# Altium integrated library 刘兴达Lib.IntLib: 614 symbols (part 2 of 4) (continued)
## MPC5602_64P (continued)

## MPU6050
designator U？  (value not drawn)
footprint MPU6050
pins: 1 CLKIN, 2 NC, 3 NC, 4 NC, 5 NC, 6 AUX_DA, 7 AUX_CL, 8 VLOGIC, 9 AD0, 10 REGOUT, 11 FSYNC, 12 INT, 13 VDD, 14 NC, 15 NC, 16 NC, 17 NC, 18 GND, 19 RESV, 20 CPOUT, 21 RESV, 22 RESV, 23 SCL, 24 SDA
text: MPU-6050

## MPU9250
designator U?  (value not drawn)
九轴陀螺仪
footprint MPU9250
pins: 1 RESV, 2 NC, 3 NC, 4 NC, 5 NC, 6 NC, 7 AUX_CL, 8 VDDIO, 9 AD0/SDO, 10 REGOUT, 11 FSYNC, 12 INT, 13 VDD, 14 NC, 15 NC, 16 NC, 17 NC, 18 GND, 19 RESV, 20 RESV, 21 AUX_DA, 22 nCS, 23 SCL/SCLK, 24 SDA/SDI
text: MPU-9250

## MPU_6050
designator U*
陀螺仪
footprint QFN_24
pins: 1 CLin, 2 NC, 3 NC, 4 NC, 5 NC, 6 DA, 7 CL, 8 VLOGIC, 9 AD0, 10 REGOUT, 11 FSYNC, 12 INT, 13 VDD, 14 NC, 15 NC, 16 NC, 17 NC, 18 GND, 19 RESV, 20 CPOUT, 21 RESV, 22 RESV, 23 SCL, 24 SDA

## MS2100
designator U?
footprint LQFP100_L (Thin QFP, 100-Leads, Body 14x14mm, Pitch 0.5mm, IPC High Density)
pins: 1 AVDD33, 2 AVSS, 3 SVCIN, 4 AVDD33, 5 AVSS, 6 SVYIN, 7 AVDD33, 8 AVIN, 9 AVSS, 10 DM13, 11 MD12, 12 MD11, 13 MD10, 14 MD9, 15 MD8, 16 MD7, 17 MD6, 18 MD5, 19 DVDD33, 20 DVSS, 21 MD4, 22 MD3, 23 MD2, 24 SDA, 25 SCL, 26 DVD33, 27 MWEB, 28 MCASB, 29 MRASB, 30 MCSB, 31 MBA0, 32 REV, 33 MA10, 34 MA0, 35 MA1, 36 MA2, 37 MA3, 38 AVSS, 39 VDD5V, 40 VDDO33, 41 VLDO12, 42 GPIO4, 43 DVDD33, 44 DVSS, 45 MA4, 46 MA5, 47 MA6, 48 MA7, 49 MA8, 50 MA9, 51 MCKE, 52 MCLK, 53 DVDD12, 54 AVDD12, 55 XTOUT, 56 XTIN, 57 AVSS, 58 AVSS, 59 AVDD33_USB, 60 REXT, 61 USBDP, 62 USBDM, 63 DVDD33, 64 GPIO0, 65 MD0, 66 MD1, 67 MD15, 68 MD14, 69 DVDD33, 70 DVSS, 71 I2S_SCLK, 72 I2S_MCLK, 73 I2S_SD0, 74 I2S_LLRCLK, 75 AVDD33_AU, 76 REV, 77 REV, 78 REV, 79 REV, 80 AVSS, 81 DVDD33, 82 NC, 83 NC, 84 DVSS, 85 NC, 86 NC, 87 NC, 88 NC, 89 NC, 90 NC, 91 NC, 92 DVDD33, 93 NC, 94 NC, 95 NC, 96 NC, 97 NC, 98 NC, 99 NC, 100 DVSS

## MT9700
designator U?
功率电子开关
footprint SOT23-5 (Max4173)
pins: 1 VOUT, 2 GND, 3 SET, 4 EN, 5 VIN

## NAND512W3A2S
designator U?
NANDFLASH
footprint TSOP-48
pins: 1 NC hidden, 2 NC hidden, 3 NC hidden, 4 NC hidden, 5 NC hidden, 6 NC hidden, 7 ~{RB}, 8 ~{R}, 9 ~{E}, 10 NC hidden, 11 NC hidden, 12 VDD, 13 VSS, 14 NC hidden, 15 NC hidden, 16 CL, 17 AL, 18 ~{W}, 19 ~{WP}, 20 NC hidden, 21 NC hidden, 22 NC hidden, 23 NC hidden, 24 NC hidden, 25 NC hidden, 26 NC hidden, 27 NC hidden, 28 NC hidden, 29 I/O0, 30 I/O1, 31 I/O2, 32 I/O3, 33 NC hidden, 34 NC hidden, 35 NC hidden, 36 VSS, 37 VDD, 38 NC hidden, 39 NC hidden, 40 NC hidden, 41 I/O4, 42 I/O5, 43 I/O6, 44 I/O7, 45 NC hidden, 46 NC hidden, 47 NC hidden, 48 NC hidden

## NC7WZU04P6X
designator U?
双反相器
footprint SC-70-6
pins: 1 A1, 2 GND, 3 A2, 4 Y2, 5 VCC, 6 Y1

## NE555
designator U?
Manufacturer: Texas Instruments; GENERIC_PART_NUMBER: NE555; INDUSTRY_STD_PKG_TYPE: SOIC; FAMILY_NAME: TIMERS(CT); PIN_COUNT: 8; PACKAGE_DESIGNATOR: D; Datasheet_URL: http://www.ti.com/lit/gpn/NE555; Copyright: Copyright (C) 2018 Accelerated Designs. All rights reserved; RefDes: RefDes; Type: DEV
footprint SOIC-8 (3mm)
pins: 1 GND (power), 2 TRIG (in), 3 OUT (out), 4 RESET (in), 5 CONT, 6 THRES (in), 7 DISCH, 8 VCC (power)

## NE555_1
designator U?  (value not drawn)
footprint SOIC-8
pins: 1 GND (power), 2 TRI (power), 3 OUT (out), 4 RESET (power), 5 CON (power), 6 THR (power), 7 DIS (power), 8 VCC (power)

## NPN1
designator Q?, comment NPN
贴片三极管; Published: 8-Jun-2000; LatestRevisionDate: 15-Jan-2003; LatestRevisionNote: PCB Footprint 'BCY-W3/D4.7' replaced; DatasheetDocument: 1997; PackageDocument: Sep-1998; PackageReference: TO-92A; Publisher: Altium Limited; Code_JEDEC: TO-92A; ComponentLink1Description: Manufacturer Link; ComponentLink1URL: http://www.fairchildsemi.com/; ComponentLink2Description: Datasheet; ComponentLink2URL: http://www.fairchildsemi.com/ds/2N%2F2N3904.pdf
footprint SOT23-3
pins: 1 B, 2 E, 3 C

## NPN2
designator Q?, comment NPN
三极管; Published: 8-Jun-2000; LatestRevisionDate: 15-Jan-2003; LatestRevisionNote: PCB Footprint 'BCY-W3/D4.7' replaced; DatasheetDocument: 1997; PackageDocument: Sep-1998; PackageReference: TO-92A; Publisher: Altium Limited; Code_JEDEC: TO-92A; ComponentLink1Description: Manufacturer Link; ComponentLink1URL: http://www.fairchildsemi.com/; ComponentLink2Description: Datasheet; ComponentLink2URL: http://www.fairchildsemi.com/ds/2N%2F2N3904.pdf
footprint TO-92A (TO, Flat Index; 3 In-Line, Axial Leads; Body Dia. 4.5mm; Leads 0.51 x 0.48 mm (max))
pins: 1 E, 2 B, 3 C

## Nucleo-64 Arduino接口
designator U?
footprint Nucleo-64 Arduino接口
pins: 1 NC, 2 3.3V, 3 NRST, 4 3.3V, 5 5V, 6 GND, 7 GND, 8 Vin, 9 PA0, 10 PA1, 11 PA4, 12 PB0, 13 PC1, 14 PC0, 15 PA3, 16 PA2, 17 PA10, 18 PB3, 19 PB5, 20 PB4, 21 PB10, 22 PA8, 23 PA9, 24 PC7, 25 PB6, 26 PA7, 27 PA6, 28 PA5, 29 GND, 30 AVDD, 31 PB9, 32 PB8

## OLED
designator U?  (value not drawn)
footprint OLED
pins: 1 GND, 2 C2P, 3 C2N, 4 C1P, 5 C1N, 6 VBAT, 7 NC, 8 VSS, 9 VDD, 10 BS0, 11 BS1, 12 BS2, 13 CS, 14 RES, 15 D/C, 16 R/W, 17 E/RD, 18 D0, 19 D1, 20 D2, 21 D3, 22 D4, 23 D5, 24 D6, 25 D7, 26 IREF, 27 VCOMH, 28 VCC, 29 VLSS, 30 GND

## OLED_1
designator U?  (value not drawn)
footprint OLED
pins: 1 GND, 2 C2P, 3 C2N, 4 C1P, 5 C1N, 6 VBAT, 7 NC, 8 VSS, 9 VDD, 10 BS0, 11 BS1, 12 BS2, 13 CS, 14 RES, 15 D/C, 16 R/W, 17 E/RD, 18 D0, 19 D1, 20 D2, 21 D3, 22 D4, 23 D5, 24 D6, 25 D7, 26 IREF, 27 VCOMH, 28 VCC, 29 VLSS, 30 GND

## OLED_SPI_7P
designator U?
footprint OLED_SPI_7P (SPI驱动0.96寸OLED)
pins: 1 GND, 2 VCC, 3 D0, 4 D1, 5 RES, 6 D/C, 7 CS
text: OLED_096

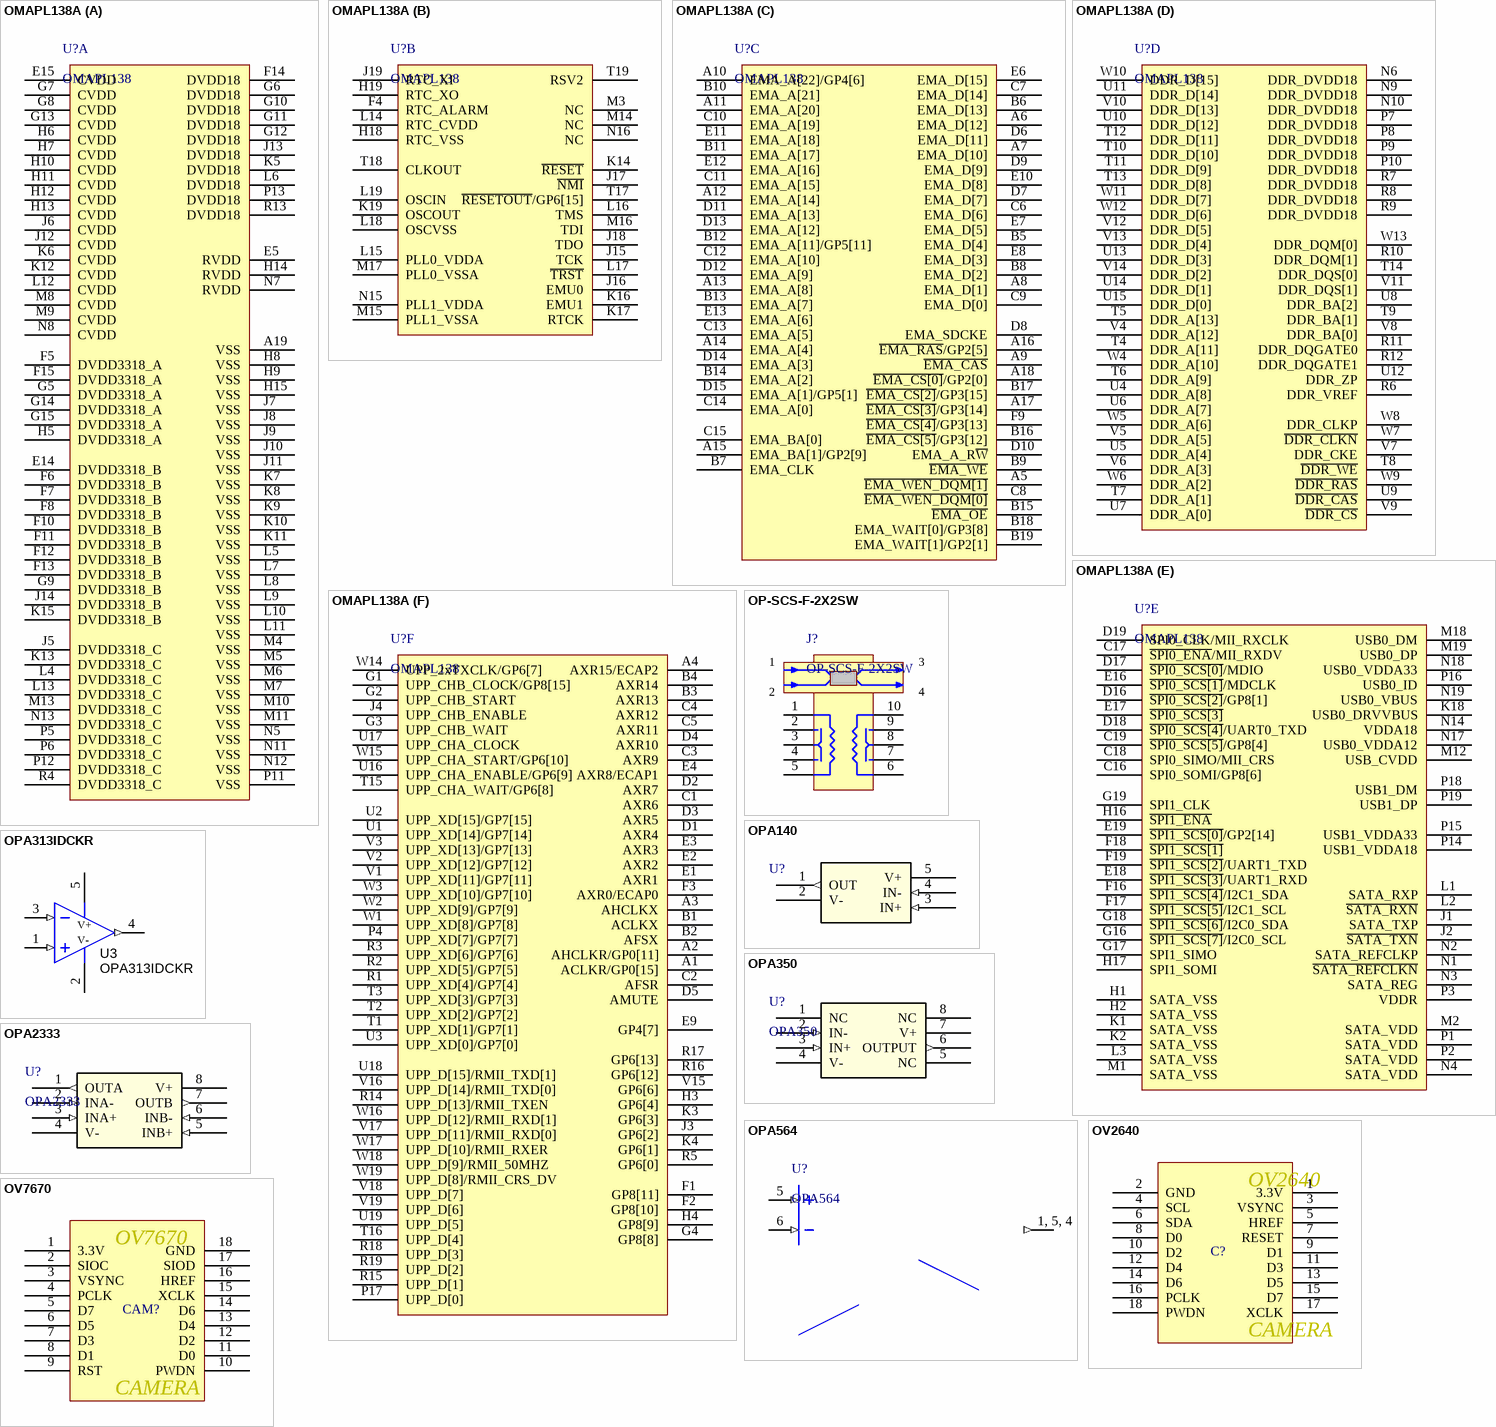
[diagram p15: symbols OMAPL138A to OV7670]

## OMAPL138A
designator U?, comment OMAPL138
DSP&ARM
footprint UFBGA361
part A pins: A19 VSS, E5 RVDD, E14 DVDD3318_B, E15 CVDD, F5 DVDD3318_A, F6 DVDD3318_B, F7 DVDD3318_B, F8 DVDD3318_B, F10 DVDD3318_B, F11 DVDD3318_B, F12 DVDD3318_B, F13 DVDD3318_B, F14 DVDD18, F15 DVDD3318_A, G5 DVDD3318_A, G6 DVDD18, G7 CVDD, G8 CVDD, G9 DVDD3318_B, G10 DVDD18, G11 DVDD18, G12 DVDD18, G13 CVDD, G14 DVDD3318_A, G15 DVDD3318_A, H5 DVDD3318_A, H6 CVDD, H7 CVDD, H8 VSS, H9 VSS, H10 CVDD, H11 CVDD, H12 CVDD, H13 CVDD, H14 RVDD, H15 VSS, J5 DVDD3318_C, J6 CVDD, J7 VSS, J8 VSS, J9 VSS, J10 VSS, J11 VSS, J12 CVDD, J13 DVDD18, J14 DVDD3318_B, K5 DVDD18, K6 CVDD, K7 VSS, K8 VSS, K9 VSS, K10 VSS, K11 VSS, K12 CVDD, K13 DVDD3318_C, K15 DVDD3318_B, L4 DVDD3318_C, L5 VSS, L6 DVDD18, L7 VSS, L8 VSS, L9 VSS, L10 VSS, L11 VSS, L12 CVDD, L13 DVDD3318_C, M4 VSS, M5 VSS, M6 VSS, M7 VSS, M8 CVDD, M9 CVDD, M10 VSS, M11 VSS, M13 DVDD3318_C, N5 VSS, N7 RVDD, N8 CVDD, N11 VSS, N12 VSS, N13 DVDD3318_C, P5 DVDD3318_C, P6 DVDD3318_C, P11 VSS, P12 DVDD3318_C, P13 DVDD18, R4 DVDD3318_C, R13 DVDD18
part B pins: F4 RTC_ALARM, H18 RTC_VSS, H19 RTC_XO, J15 TCK, J16 EMU0, J17 ~{NMI}, J18 TDO, J19 RTC_XI, K14 ~{RESET}, K16 EMU1, K17 RTCK, K19 OSCOUT, L14 RTC_CVDD, L15 PLL0_VDDA, L16 TMS, L17 ~{TRST}, L18 OSCVSS, L19 OSCIN, M3 NC, M14 NC, M15 PLL1_VSSA, M16 TDI, M17 PLL0_VSSA, N15 PLL1_VDDA, N16 NC, T17 ~{RESETOUT}/GP6[15], T18 CLKOUT, T19 RSV2
part C pins: A5 ~{EMA_WEN_DQM[1]}, A6 EMA_D[12], A7 EMA_D[10], A8 EMA_D[1], A9 ~{EMA_CAS}, A10 EMA_A[22]/GP4[6], A11 EMA_A[20], A12 EMA_A[14], A13 EMA_A[8], A14 EMA_A[4], A15 EMA_BA[1]/GP2[9], A16 ~{EMA_RAS}/GP2[5], A17 ~{EMA_CS[3]}/GP3[14], A18 ~{EMA_CS[0]}/GP2[0], B5 EMA_D[4], B6 EMA_D[13], B7 EMA_CLK, B8 EMA_D[2], B9 ~{EMA_WE}, B10 EMA_A[21], B11 EMA_A[17], B12 EMA_A[11]/GP5[11], B13 EMA_A[7], B14 EMA_A[2], B15 ~{EMA_OE}, B16 ~{EMA_CS[5]}/GP3[12], B17 ~{EMA_CS[2]}/GP3[15], B18 EMA_WAIT[0]/GP3[8], B19 EMA_WAIT[1]/GP2[1], C6 EMA_D[6], C7 EMA_D[14], C8 ~{EMA_WEN_DQM[0]}, C9 EMA_D[0], C10 EMA_A[19], C11 EMA_A[15], C12 EMA_A[10], C13 EMA_A[5], C14 EMA_A[0], C15 EMA_BA[0], D6 EMA_D[11], D7 EMA_D[7], D8 EMA_SDCKE, D9 EMA_D[9], D10 EMA_A_R~{W}, D11 EMA_A[13], D12 EMA_A[9], D13 EMA_A[12], D14 EMA_A[3], D15 EMA_A[1]/GP5[1], E6 EMA_D[15], E7 EMA_D[5], E8 EMA_D[3], E10 EMA_D[8], E11 EMA_A[18], E12 EMA_A[16], E13 EMA_A[6], F9 ~{EMA_CS[4]}/GP3[13]
part D pins: N6 DDR_DVDD18, N9 DDR_DVDD18, N10 DDR_DVDD18, P7 DDR_DVDD18, P8 DDR_DVDD18, P9 DDR_DVDD18, P10 DDR_DVDD18, R6 DDR_VREF, R7 DDR_DVDD18, R8 DDR_DVDD18, R9 DDR_DVDD18, R10 DDR_DQM[1], R11 DDR_DQGATE0, R12 DDR_DQGATE1, T4 DDR_A[11], T5 DDR_A[13], T6 DDR_A[9], T7 DDR_A[1], T8 ~{DDR_WE}, T9 DDR_BA[1], T10 DDR_D[10], T11 DDR_D[9], T12 DDR_D[11], T13 DDR_D[8], T14 DDR_DQS[0], U4 DDR_A[8], U5 DDR_A[4], U6 DDR_A[7], U7 DDR_A[0], U8 DDR_BA[2], U9 ~{DDR_CAS}, U10 DDR_D[12], U11 DDR_D[14], U12 DDR_ZP, U13 DDR_D[3], U14 DDR_D[1], U15 DDR_D[0], V4 DDR_A[12], V5 DDR_A[5], V6 DDR_A[3], V7 DDR_CKE, V8 DDR_BA[0], V9 ~{DDR_CS}, V10 DDR_D[13], V11 DDR_DQS[1], V12 DDR_D[5], V13 DDR_D[4], V14 DDR_D[2], W4 DDR_A[10], W5 DDR_A[6], W6 DDR_A[2], W7 ~{DDR_CLKN}, W8 DDR_CLKP, W9 ~{DDR_RAS}, W10 DDR_D[15], W11 DDR_D[7], W12 DDR_D[6], W13 DDR_DQM[0]
part E pins: C16 SPI0_SOMI/GP8[6], C17 ~{SPI0_ENA}/MII_RXDV, C18 SPI0_SIMO/MII_CRS, C19 ~{SPI0_SCS[5]}/GP8[4], D16 ~{SPI0_SCS[2]}/GP8[1], D17 ~{SPI0_SCS[0]}/MDIO, D18 ~{SPI0_SCS[4]}/UART0_TXD, D19 SPI0_CLK/MII_RXCLK, E16 ~{SPI0_SCS[1]}/MDCLK, E17 ~{SPI0_SCS[3]}, E18 ~{SPI1_SCS[3]}/UART1_RXD, E19 ~{SPI1_SCS[0]}/GP2[14], F16 ~{SPI1_SCS[4]}/I2C1_SDA, F17 ~{SPI1_SCS[5]}/I2C1_SCL, F18 ~{SPI1_SCS[1]}, F19 ~{SPI1_SCS[2]}/UART1_TXD, G16 ~{SPI1_SCS[7]}/I2C0_SCL, G17 SPI1_SIMO, G18 ~{SPI1_SCS[6]}/I2C0_SDA, G19 SPI1_CLK, H1 SATA_VSS, H2 SATA_VSS, H16 ~{SPI1_ENA}, H17 SPI1_SOMI, J1 SATA_TXP, J2 ~{SATA_TXN}, K1 SATA_VSS, K2 SATA_VSS, K18 USB0_DRVVBUS, L1 SATA_RXP, L2 ~{SATA_RXN}, L3 SATA_VSS, M1 SATA_VSS, M2 SATA_VDD, M12 USB_CVDD, M18 USB0_DM, M19 USB0_DP, N1 ~{SATA_REFCLKN}, N2 SATA_REFCLKP, N3 SATA_REG, N4 SATA_VDD, N14 VDDA18, N17 USB0_VDDA12, N18 USB0_VDDA33, N19 USB0_VBUS, P1 SATA_VDD, P2 SATA_VDD, P3 VDDR, P14 USB1_VDDA18, P15 USB1_VDDA33, P16 USB0_ID, P18 USB1_DM, P19 USB1_DP
part F pins: A1 ACLKR/GP0[15], A2 AHCLKR/GP0[11], A3 AHCLKX, A4 AXR15/ECAP2, B1 ACLKX, B2 AFSX, B3 AXR13, B4 AXR14, C1 AXR6, C2 AFSR, C3 AXR9, C4 AXR12, C5 AXR11, D1 AXR4, D2 AXR7, D3 AXR5, D4 AXR10, D5 AMUTE, E1 AXR1, E2 AXR2, E3 AXR3, E4 AXR8/ECAP1, E9 GP4[7], F1 GP8[11], F2 GP8[10], F3 AXR0/ECAP0, G1 UPP_CHB_CLOCK/GP8[15], G2 UPP_CHB_START, G3 UPP_CHB_WAIT, G4 GP8[8], H3 GP6[4], H4 GP8[9], J3 GP6[2], J4 UPP_CHB_ENABLE, K3 GP6[3], K4 GP6[1], P4 UPP_XD[7]/GP7[7], P17 UPP_D[0], R1 UPP_XD[4]/GP7[4], R2 UPP_XD[5]/GP7[5], R3 UPP_XD[6]/GP7[6], R5 GP6[0], R14 UPP_D[13]/RMII_TXEN, R15 UPP_D[1], R16 GP6[12], R17 GP6[13], R18 UPP_D[3], R19 UPP_D[2], T1 UPP_XD[1]/GP7[1], T2 UPP_XD[2]/GP7[2], T3 UPP_XD[3]/GP7[3], T15 UPP_CHA_WAIT/GP6[8], T16 UPP_D[4], U1 UPP_XD[14]/GP7[14], U2 UPP_XD[15]/GP7[15], U3 UPP_XD[0]/GP7[0], U16 UPP_CHA_ENABLE/GP6[9], U17 UPP_CHA_CLOCK, U18 UPP_D[15]/RMII_TXD[1], U19 UPP_D[5], V1 UPP_XD[11]/GP7[11], V2 UPP_XD[12]/GP7[12], V3 UPP_XD[13]/GP7[13], V15 GP6[6], V16 UPP_D[14]/RMII_TXD[0], V17 UPP_D[11]/RMII_RXD[0], V18 UPP_D[7], V19 UPP_D[6], W1 UPP_XD[8]/GP7[8], W2 UPP_XD[9]/GP7[9], W3 UPP_XD[10]/GP7[10], W14 UPP_2xTXCLK/GP6[7], W15 UPP_CHA_START/GP6[10], W16 UPP_D[12]/RMII_RXD[1], W17 UPP_D[10]/RMII_RXER, W18 UPP_D[9]/RMII_50MHZ, W19 UPP_D[8]/RMII_CRS_DV

## OP-SCS-F-2X2SW
designator J?
光开关
footprint SCS-F-2X2
pins: 1 SWA, 2 SWAK1, 3 SWAK2, 4 SWAK3, 5 SWA, 6 SWB, 7 SWBK3, 8 SWBK2, 9 SWBK1, 10 SWB

## OPA140
designator U?
11MHz 单电源、低噪声、精密轨至轨输出 JFET 放大器; Manufacturer: Texas Instruments; Manufacturer_Part_Number: OPA140AIDBVR; Built_By: EMA_UL_Team; Vendor: Texas Instruments; Copyright: Copyright (C) 2018 Accelerated Designs. All rights reserved; RefDes: RefDes; Type: DEV; Value: Value
footprint SOT-23-5
pins: 1 OUT (out), 2 V- (power), 3 IN+ (in), 4 IN- (in), 5 V+ (power)

## OPA313IDCKR
designator U3
运放; Alternate PartNumber: OPA313IDCKT; Manufacturer: Texas Instruments; CompType: IC; Sim Note: Shutdown not modeled; U/M: EA; SymbolVersion: 2008-11-25; PartNumber: OPA313IDCKR; PackageReference: DCK0005A; MountType: SMT; ComponentLink1Description: Datasheet Link; ComponentLink1URL: http://www.ti.com/lit/ds/symlink/opa313.pdf; RoHS: Y; Publisher: Texas Instruments; LatestRevisionDate: 2016-03-11; Alternate Manufacturer: Texas Instruments
footprint SC-70-5
pins: 1 IN+ (in), 2 V- (power), 3 IN- (in), 4 OUT (out), 5 V+ (power)
1 alternate drawing of the same symbol

## OPA350
designator U?
单电源轨至轨运算放大器; Manufacturer_Part_Number: OPA350UA; Vendor: Texas Instruments; Built_By: EMA_UL_Team; Copyright: Copyright (C) 2018 Accelerated Designs. All rights reserved; RefDes: RefDes; Type: DEV; Value: Value
footprint SOIC-8 (3mm)
footprint VSSOP-8
pins: 1 NC, 2 IN- (in), 3 IN+ (in), 4 V- (power), 5 NC, 6 OUTPUT (out), 7 V+ (power), 8 NC

## OPA564
designator U?
功率运算放大器
footprint TSSOP-20P (TSOP, 20-Leads, Body 6.5x4.4mm, Pitch 0.65mm, IPC Low Density)
pins: 1, 5, 4  OUT (out), 5 IN+ (in), 6 IN- (in)

## OPA2333
designator U?
Manufacturer: Texas Instruments; GENERIC_PART_NUMBER: OPA2333-HT; Manufacturer_Part_Number: OPA2333SJD; INDUSTRY_STD_PKG_TYPE: CDIP SB; FAMILY_NAME: LOW OFFSET VOLTAGE; PIN_COUNT: 8; PACKAGE_DESIGNATOR: JD; Datasheet_URL: http://www.ti.com/lit/gpn/OPA2333-HT; Vendor: Texas Instruments; Copyright: Copyright (C) 2018 Accelerated Designs. All rights reserved; RefDes: RefDes; Type: DEV
footprint MSOP-8
footprint SOIC-8 (3mm)
pins: 1 OUTA (out), 2 INA- (in), 3 INA+ (in), 4 V- (power), 5 INB+ (in), 6 INB- (in), 7 OUTB (out), 8 V+ (power)

## OV2640
designator C?  (value not drawn)
摄像头
footprint OV2640
pins: 1 3.3V, 2 GND, 3 VSYNC, 4 SCL, 5 HREF, 6 SDA, 7 RESET, 8 D0, 9 D1, 10 D2, 11 D3, 12 D4, 13 D5, 14 D6, 15 D7, 16 PCLK, 17 XCLK, 18 PWDN
text: CAMERA

## OV7670
designator CAM?  (value not drawn)
摄像头
footprint OV7670
pins: 1 3.3V, 2 SIOC, 3 VSYNC, 4 PCLK, 5 D7, 6 D5, 7 D3, 8 D1, 9 RST, 10 PWDN, 11 D0, 12 D2, 13 D4, 14 D6, 15 XCLK, 16 HREF, 17 SIOD, 18 GND
text: CAMERA

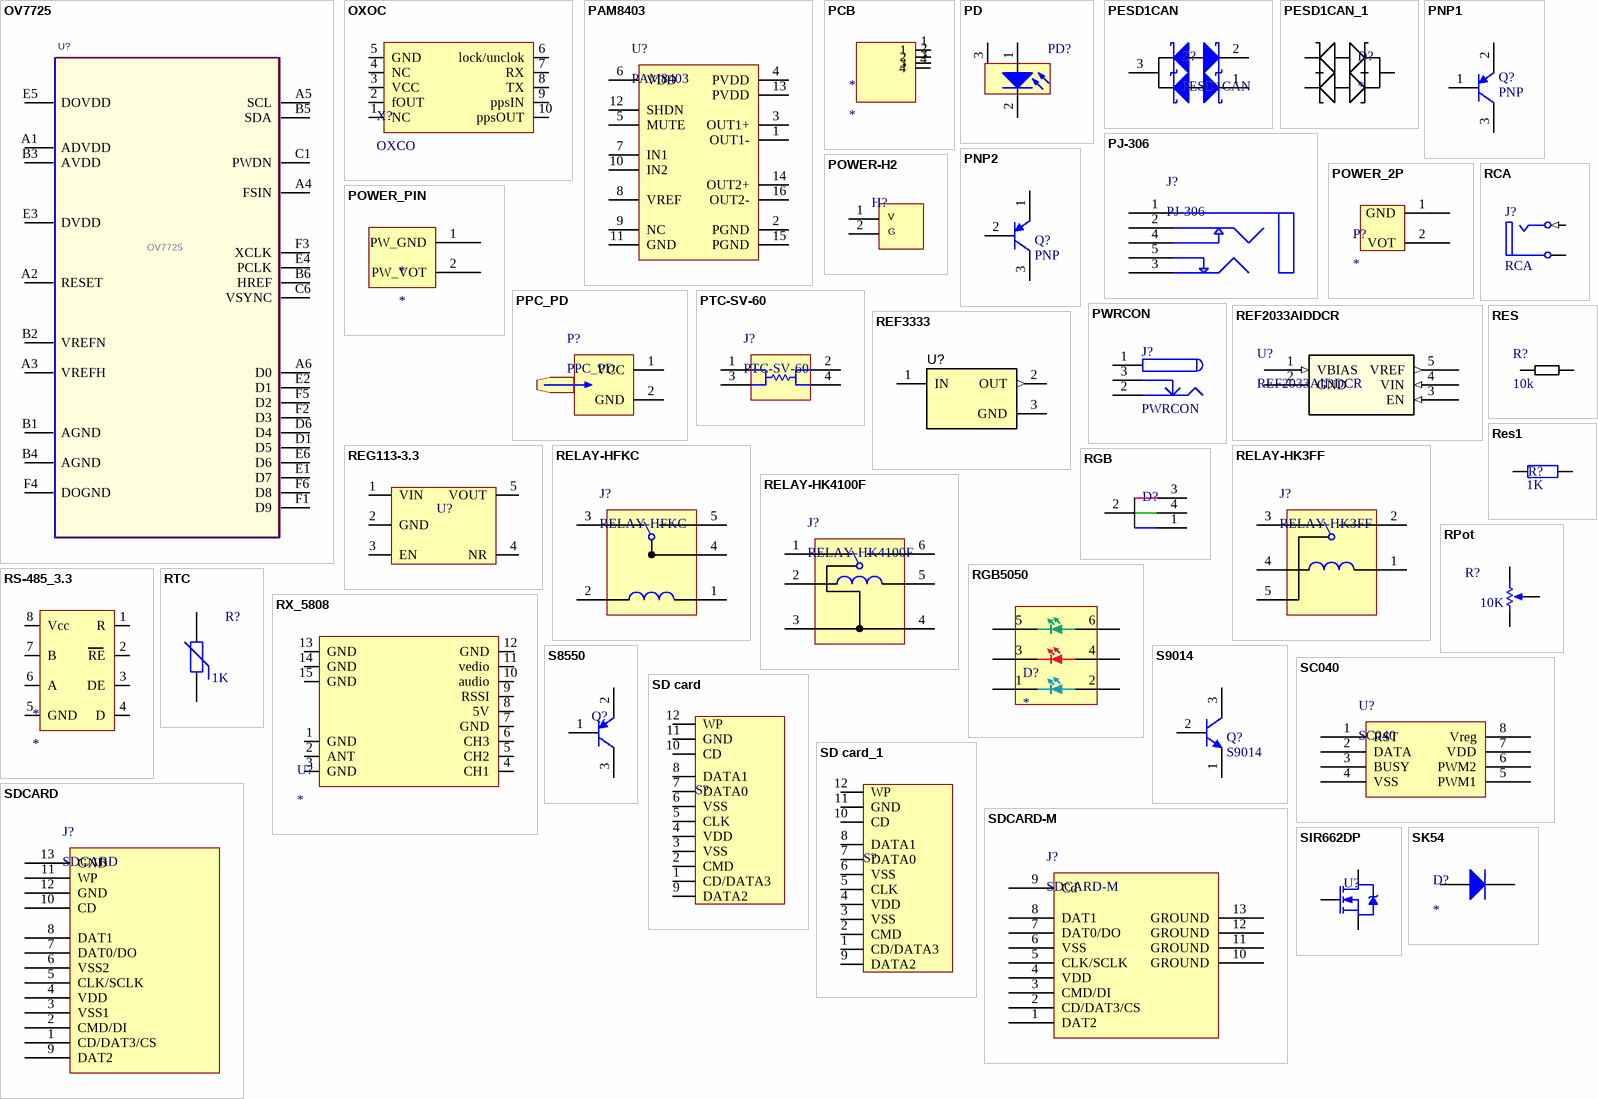
[diagram p16: symbols OV7725 to SK54]

## OV7725
designator U?  value OV7725
CMOS图像传感器; Manufacture 1: OV; Assembly: SMD; PCB DECAL: OV7725_CSP2_FIRE; Manufacture 1 P/N: OV7725
footprint CSP2-28
pins: A1 ADVDD, A2 RESET, A3 VREFH, A4 FSIN, A5 SCL, A6 D0, B1 AGND, B2 VREFN, B3 AVDD, B4 AGND, B5 SDA, B6 HREF, C1 PWDN, C6 VSYNC, D1 D5, D6 D4, E1 D7, E2 D1, E3 DVDD, E4 PCLK, E5 DOVDD, E6 D6, F1 D9, F2 D3, F3 XCLK, F4 DOGND, F5 D2, F6 D8

## OXOC
designator X?, comment OXCO
时钟驯服板
footprint OCXO (时钟驯服板)
pins: 1 NC, 2 fOUT, 3 VCC, 4 NC, 5 GND, 6 lock/unclok, 7 RX, 8 TX, 9 ppsIN, 10 ppsOUT

## PAM8403
designator U?
音频运放
footprint SOIC-16
pins: 1 OUT1-, 2 PGND, 3 OUT1+, 4 PVDD, 5 MUTE, 6 VDD, 7 IN1, 8 VREF, 9 NC, 10 IN2, 11 GND, 12 SHDN, 13 PVDD, 14 OUT2+, 15 PGND, 16 OUT2-

## PCB
designator *
pins: 1, 2, 3, 4

## PD
designator PD?  (value not drawn)
光电二极管; Published: 24-Mar-1999; LatestRevisionDate: 17-Jul-2002; LatestRevisionNote: Re-released for DXP Platform.; Publisher: Altium Limited; PackageReference: PD
footprint PD
footprint PD-SMD (光电二极管)
footprint PD-H (光电二极管)
pins: 1 A, 2 K, 3 0

## PESD1CAN
designator Z?
过压保护
footprint SOT23-3
pins: 1, 2, 3

## PESD1CAN_1
designator D?
CAN线ESD保护
footprint SOT-23-3
pins: 1, 2, 3

## PJ-306
designator J?
立体声耳机插座
footprint PJ-315-B (立体声耳机插座)
footprint PJ-306 (立体声耳机插座)
footprint 3F07 (立体声耳机插座)
pins: 1 COM, 2 L, 3 R, 4 L1, 5 R1

## PNP1
designator Q?, comment PNP
贴片三极管; Published: 8-Jun-2000; LatestRevisionDate: 15-Jan-2003; LatestRevisionNote: PCB Footprint 'BCY-W3/D4.7' replaced; DatasheetDocument: 1997; PackageDocument: Sep-1998; PackageReference: TO-92A; Publisher: Altium Limited; Code_JEDEC: TO-92A; ComponentLink1Description: Manufacturer Link; ComponentLink1URL: http://www.fairchildsemi.com/; ComponentLink2Description: Datasheet; ComponentLink2URL: http://www.fairchildsemi.com/ds/2N%2F2N3906.pdf
footprint SOT23-3
pins: 1 B, 2 E, 3 C

## PNP2
designator Q?, comment PNP
三极管; Published: 8-Jun-2000; LatestRevisionDate: 15-Jan-2003; LatestRevisionNote: PCB Footprint 'BCY-W3/D4.7' replaced; DatasheetDocument: 1997; PackageDocument: Sep-1998; PackageReference: TO-92A; Publisher: Altium Limited; Code_JEDEC: TO-92A; ComponentLink1Description: Manufacturer Link; ComponentLink1URL: http://www.fairchildsemi.com/; ComponentLink2Description: Datasheet; ComponentLink2URL: http://www.fairchildsemi.com/ds/2N%2F2N3906.pdf
footprint TO-92A (TO, Flat Index; 3 In-Line, Axial Leads; Body Dia. 4.5mm; Leads 0.51 x 0.48 mm (max))
pins: 1 E, 2 B, 3 C

## POWER-H2
designator H?  (value not drawn)
功率插座
footprint XT30UPB-F
footprint XT30UPB-M
footprint XT60PB-M
footprint XT60PW-F
footprint 8.4mm间距接线柱
footprint 9.5mm 接线座
footprint XT60PW-M
footprint XT30PW-F
pins: 1, 2
text: V; G

## POWER_2P
designator P?
间距200mil接口
footprint Power_2p (拧螺丝的那种两个口接口)
pins: 1 GND, 2 VOT

## POWER_PIN
designator *
电源接口
footprint Power_Pin (某种电源接口)
pins: 1 PW_GND, 2 PW_VOT

## PPC_PD
designator P?
footprint PPC_PD
pins: 1 VCC, 2 GND

## PTC-SV-60
designator J?
footprint PTC-SV-D20 (PTC加热片)
pins: 1, 2, 3, 4

## PWRCON
designator J?
直流电源端子; Published: 17-Dec-2003; DatasheetDocument: 09-May-2002; Publisher: Altium Limited; ComponentLink1Description: Manufacturer Link; ComponentLink1URL: http://domino.kycon.com/internet/Products.html
footprint DC-005 (DC母座5.5mm)
footprint DC-002 (DC母座3.5mm)
pins: 1 (power), 2 (power), 3 (power)

## RCA
designator J?
RCA Phono Jack; PCB_Layout: Complies with manufacturer's recommendation.; DrillAndSlotSize: Corresponds to nominal value.; Published: 15-Jul-2004; LatestRevisionDate: 15-Jul-2004; LatestRevisionNote: Component Replaced.; DatasheetDocument: 7-Jul-2000; PackageDocument: 7-Jul-2000; PackageReference: 161; Publisher: Altium Limited; ComponentLink1Description: Manufacturer Link; ComponentLink1URL: http://www.mouser.com/kobiconn/
footprint RCA/4.5-H2 (Two Conductor Jack (RCA))
footprint RCJ-04X (Two Conductor Jack (RCA))
pins: 1A Ground (power) "Outer Shield (Sleeve)", 2B Signal (in) "Center Pin (Plug Tip)"

## REF2033AIDDCR
designator U?
3.3V 1.65V基准; Vendor: Texas Instruments; Built_By: EMA_UL_Team; Manufacturer_Part_Number: REF2033AIDDCR; Copyright: Copyright (C) 2018 Accelerated Designs. All rights reserved; RefDes: RefDes; Type: DEV; Value: Value
footprint SOT-23-5
pins: 1 VBIAS (in), 2 GND (power), 3 EN (in), 4 VIN (in), 5 VREF (out)

## REF3333
designator U?
电压基准芯片; Manufacturer: Texas Instruments; PartNumber: REF3325AIDCKTG4; Alternate PartNumber: Equivalent; Eco-Plan: Green (RoHS & no Sb/Br); Initial Accuracy @ 25/deg C(%): 0.15; Iout/Iz(Max)(mA): 5; Rating: Catalog; SubFamily: Series Voltage Reference; Temp Coeff(Max)(ppm/ degree C): 30; Temp Coeff(Typ)(ppm/ degree C): 8; VI(Max)(V): 5.5; VI(Min)(V): 2.66; VO(V): 2.5; DatasheetVersion: SBOS392A; PackageReference: DCK0003A; PackageDescription: 3-Pin Plastic Small Outline, Body 2 x 1.25 mm, Pitch 0.65 mm; Supplier 1: Digi-Key; Supplier Part Number 1: REF3325AIDCKTG4-ND; Supplier 2: Newark; Supplier Part Number 2: 58M1154; Supplier 3: Mouser; Supplier Part Number 3: 595-REF3325AIDCKTG4; Iq(Max)(uA): 5; MountType: SMT; ComponentLink1Description: Manufacturer URL; ComponentLink1URL: http://www.ti.com/; ComponentLink2Description: Datasheet; ComponentLink2URL: http://www.ti.com/general/docs/lit/getliterature.tsp?genericPartNumber=REF3325&fileType=pdf; ComponentLink3Description: Package Specification; ComponentLink3URL: http://www.ti.com/litv/pdf/mpds295a; Alternate Manufacturer: Texas Instruments
footprint SOT23-3
pins: 1 IN (power), 2 OUT (out), 3 GND (power)

## REG113-3.3
designator U?  (value not drawn)
3.3V稳压电源
footprint REG113-3.3
pins: 1 VIN, 2 GND, 3 EN, 4 NR, 5 VOUT

## RELAY-HFKC
designator J?
单刀双掷继电器
footprint HFKC (继电器)
pins: 1, 2, 3, 4, 5

## RELAY-HK3FF
designator J?
单刀双掷继电器
footprint RELAY-HK3FF (继电器)
pins: 1, 2, 3, 4, 5

## RELAY-HK4100F
designator J?
单刀双掷继电器
footprint RELAY-HK4100F (继电器)
pins: 1, 2, 3, 4, 5, 6

## RES
designator R?, comment 10k
电阻; Manufacturer_Part_Number: ERJ-6GEYJ335V; Vendor: Panasonic; Built_By: EMA_UL_Team; Copyright: Copyright (C) 2018 Accelerated Designs. All rights reserved; RefDes: RefDes; Type: DEV; Value: Value
footprint R0805
footprint R0603
footprint R1206
footprint R2010
footprint R0402
pins: 1, 2

## Res1
designator R?  value 1K  (hidden comment: Res1)
贴片电阻; Published: 8-Jun-2000; LatestRevisionDate: 17-Jul-2002; LatestRevisionNote: Re-released for DXP Platform.; PackageReference: AXIAL-0.4; Publisher: Altium Limited
footprint 0805-1 (贴片带丝印)
footprint 0805-2 (贴片无丝印)
footprint 0603-1 (贴片带丝印)
footprint 1210 (贴片元件)
footprint AXIAL-0.8 (Semiconductor Resistor; 2 Leads)
footprint 2010 (贴片电阻)
footprint 0603-2 (贴片无丝印)
footprint 1206
footprint 2512 (保险丝)
footprint 1812 (保险丝)
footprint AXIAL-0.9 (插件电阻)
pins: 1, 2

## RGB
designator D?  (value not drawn)
三色LED
footprint RGB
pins: 1 OUT, 2 OUT, 3 OUT, 4 OUT

## RGB5050
designator D?
footprint RGB5050
pins: 1 G, 2 G, 3 G, 4 G, 5 G, 6 R

## RPot
designator R?  value 10K  (hidden comment: RPot)
精密可调电阻; Sim Note: Enter the Resistance value and the set point into parameter fields.; Set Position: 0.5; Published: 8-Jun-2000; LatestRevisionDate: 17-Jul-2002; LatestRevisionNote: Re-released for DXP Platform.; PackageReference: VR5; Publisher: Altium Limited
footprint VR-3296W (Potentiometer; 3 Leads)
footprint VR-3296X (Potentiometer; 3 Leads)
footprint VR-3006P
footprint VR_3362P (Potentiometer; 3 Leads)
pins: 1 TOP, 2 TAP, 3 BOT
1 alternate drawing of the same symbol

## RS-485_3.3
designator *
footprint SOIC-8
pins: 1 R, 2 RE, 3 DE, 4 D, 5 GND, 6 A, 7 B, 8 Vcc

## RTC
designator R?  value 1K  (hidden comment: RTC)
热敏电阻; Published: 24-Mar-1999; LatestRevisionDate: 29-May-2009; LatestRevisionNote: IPC-7351 Footprint Added.; PackageVersion: Mar-2003; PackageReference: 6-0805; Publisher: Altium Limited; PackageDescription: Chip Resistor 0805 Case Size
footprint 0603-1 (0603带丝印)
footprint 0805-1 (0805带丝印)
pins: 1, 2

## RX_5808
designator U?
footprint RX_5808 (图传接收)
pins: 1 GND, 2 ANT, 3 GND, 4 CH1, 5 CH2, 6 CH3, 7 GND, 8 5V, 9 RSSI, 10 audio, 11 vedio, 12 GND, 13 GND, 14 GND, 15 GND

## S8550
designator Q?  (value not drawn)
pins: 1 B, 2 E, 3 C

## S9014
designator Q?
NPN三极管; Published: 8-Jun-2000; LatestRevisionDate: 15-Jan-2003; LatestRevisionNote: PCB Footprint 'BCY-W3/D4.7' replaced; DatasheetDocument: 1997; PackageDocument: Sep-1998; PackageReference: TO-92A; Publisher: Altium Limited; Code_JEDEC: TO-92A; ComponentLink1Description: Manufacturer Link; ComponentLink1URL: http://www.fairchildsemi.com/; ComponentLink2Description: Datasheet; ComponentLink2URL: http://www.fairchildsemi.com/ds/2N%2F2N3904.pdf
footprint TO-92A (TO, Flat Index; 3 In-Line, Axial Leads; Body Dia. 4.5mm; Leads 0.51 x 0.48 mm (max))
pins: 1 E, 2 B, 3 C

## SC040
designator U?
语音
footprint SOIC-8
pins: 1 RST, 2 DATA, 3 BUSY, 4 VSS, 5 PWM1, 6 PWM2, 7 VDD, 8 Vreg

## SD card
designator S?  (value not drawn)
footprint SDcard
pins: 1 CD/DATA3, 2 CMD, 3 VSS, 4 VDD, 5 CLK, 6 VSS, 7 DATA0, 8 DATA1, 9 DATA2, 10 CD, 11 GND, 12 WP

## SD card_1
designator S?  (value not drawn)
footprint SDcard
pins: 1 CD/DATA3, 2 CMD, 3 VSS, 4 VDD, 5 CLK, 6 VSS, 7 DATA0, 8 DATA1, 9 DATA2, 10 CD, 11 GND, 12 WP

## SDCARD
designator J?
SD卡自弹
footprint SDCARD_B (SD卡自弹)
pins: 1 CD/DAT3/CS, 2 CMD/DI, 3 VSS1, 4 VDD, 5 CLK/SCLK, 6 VSS2, 7 DAT0/DO, 8 DAT1, 9 DAT2, 10 CD, 11 WP, 12 GND, 13 GND

## SDCARD-M
designator J?
TF卡槽
footprint SDCARD-M (TF卡)
pins: 1 DAT2, 2 CD/DAT3/CS, 3 CMD/DI, 4 VDD, 5 CLK/SCLK, 6 VSS, 7 DAT0/DO, 8 DAT1, 9 Cd, 10 GROUND, 11 GROUND, 12 GROUND, 13 GROUND

## SIR662DP
designator U?  (value not drawn)
N-MOS
footprint SIR662DP
pins: D, G, S

## SK54
designator D?
肖特基二极管
footprint SMC_6.9*6.9
pins: 1 A, 2 K

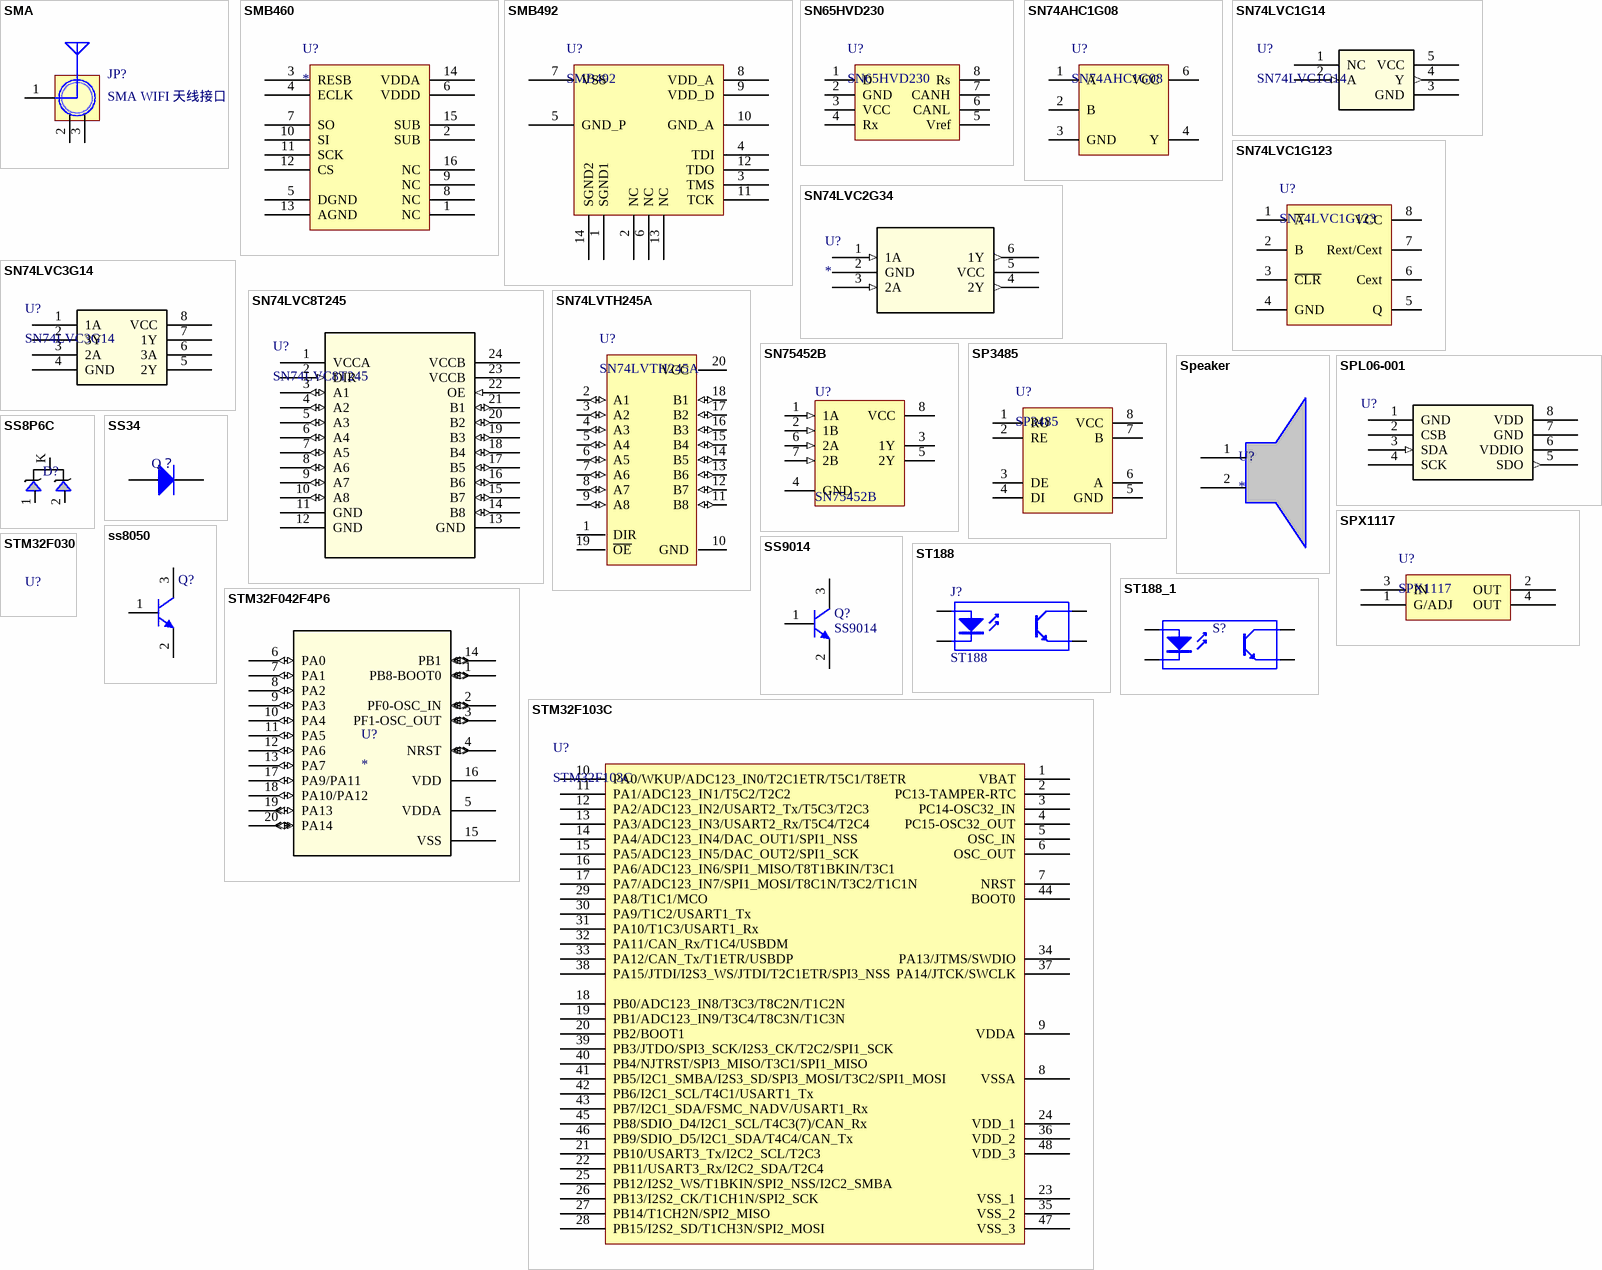
[diagram p17: symbols SMA to STM32F103C]